# Altium footprint library Nhat_Lib.PcbLib: 84 footprints (part 5 of 6)
Each footprint in its own frame and in the unit in brackets; x right, y up, seen from the top. Pads: shape width x height; smd on the part's side, far side on the other; paste and mask are expansions set on the pad; w line width, h text height; cw(c..) or ccw(c..) is an arc to the next point about the centre after c.
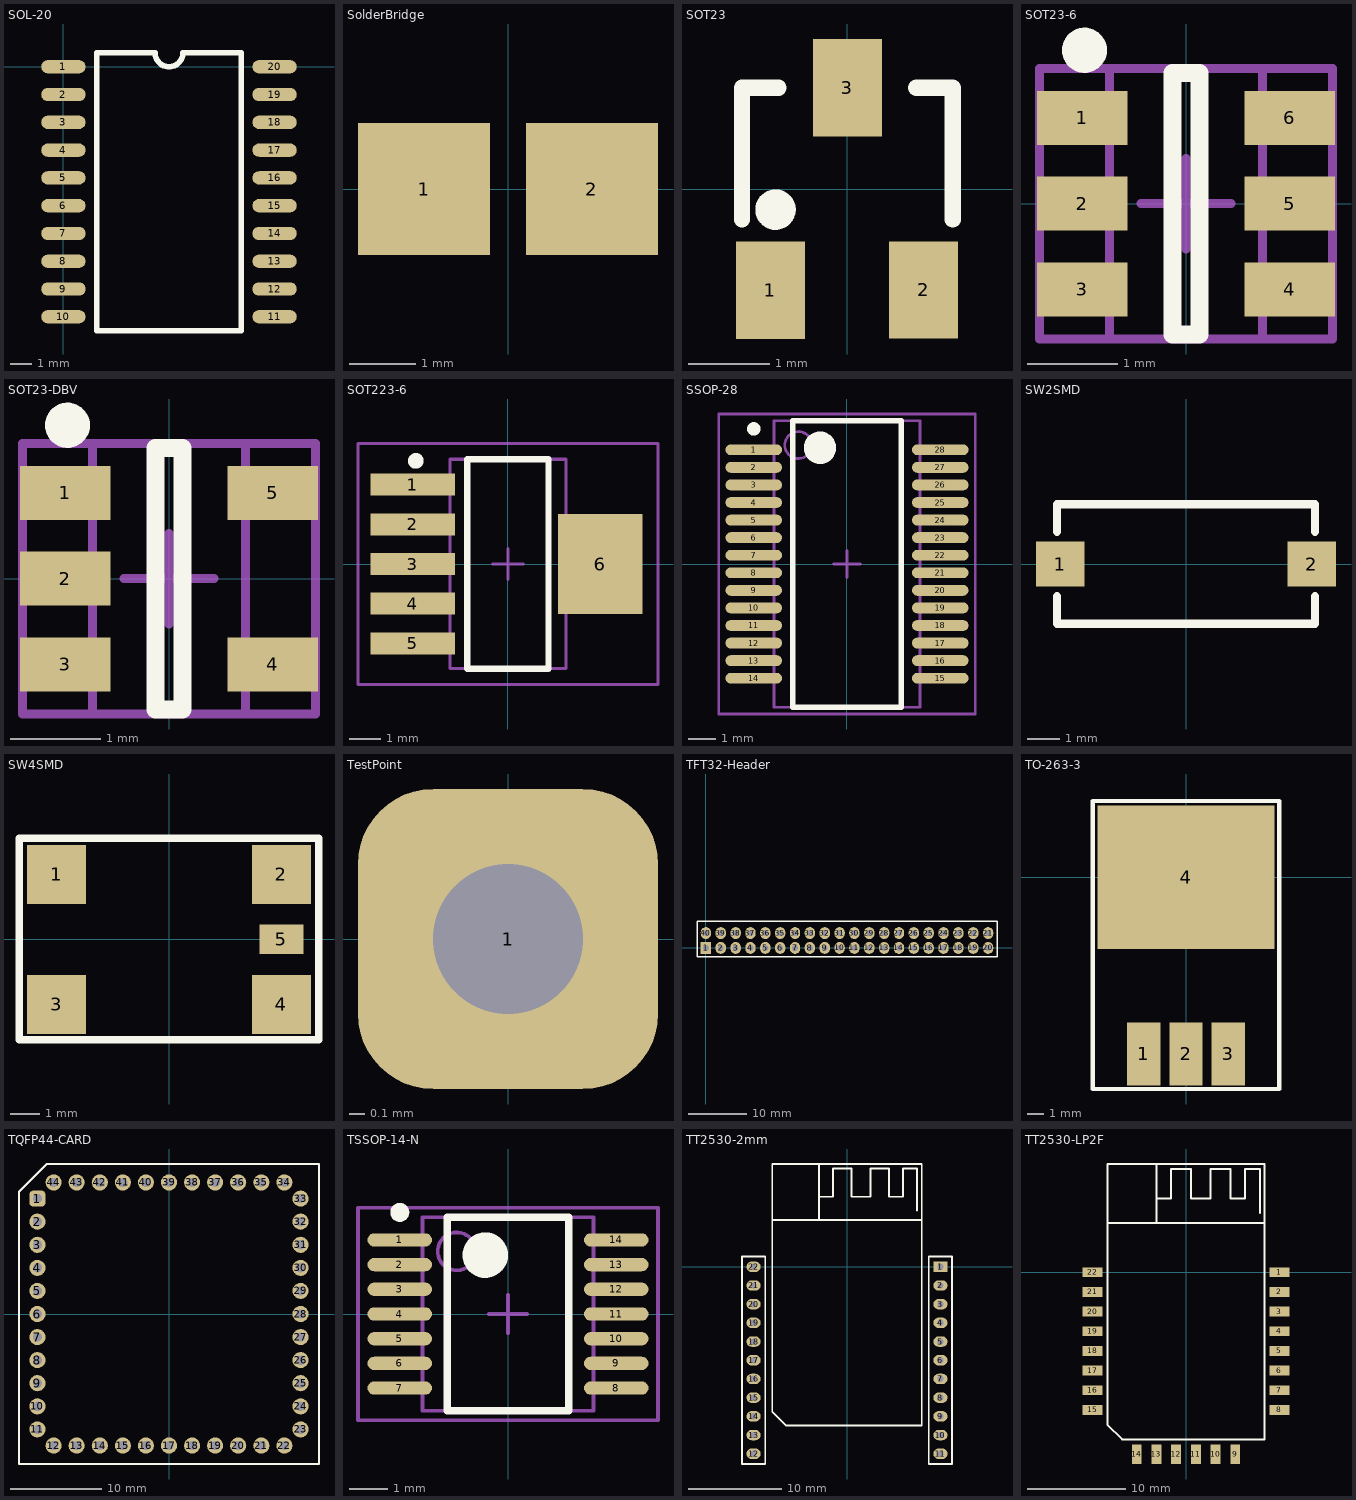
[diagram p4: the footprints below, top view; thin cyan lines are the x and y axes]

## SOL-20 [mil]
pads (20):
  oval 80x24 smd: 1(0,0) 2(0,-50) 3(0,-100) 4(0,-150) 5(0,-200) 6(0,-250) 7(0,-300) 8(0,-350) 9(0,-400) 10(0,-450) 11(380,-450) 12(380,-400) 13(380,-350) 14(380,-300) 15(380,-250) 16(380,-200) 17(380,-150) 18(380,-100) 19(380,-50) 20(380,0)
Top Overlay:
  lines w10: 60,-475 60,25 165,25 ccw(c190,25) 215,25 320,25 320,-475 60,-475

## SolderBridge [mm]
pads (2):
  rect 2x2 smd: 1(-1.27,0) 2(1.27,0)

## SOT23 [mm]
pads (3):
  rect 0.85x1.2 smd: 1(-0.95,-1.25) 2(0.94,-1.245) 3(0,1.25)
Top Overlay:
  circle w0.25: c-0.887,-0.254 r0.125
  lines w0.2: -1.3,-0.375 -1.3,1.25 -0.85,1.25 ; 0.85,1.25 1.3,1.25 1.3,-0.375
3D body: height 1.3, standoff 0, extent -1.45,-1.4 1.45,1.4

## SOT23-6 [mm]
pads (6):
  rect 1x0.6 smd: 1(-1.15,0.95) 2(-1.15,0) 3(-1.15,-0.95) 4(1.15,-0.95) 5(1.15,0) 6(1.15,0.95)
Top Overlay:
  circle w0.25: c-1.125,1.7 r0.125
  lines w0.2: -0.15,-1.45 0.15,-1.45 0.15,1.45 -0.15,1.45 -0.15,-1.45
Mechanical 13:
  lines w0.1: -0.85,-1.5 -0.85,1.5 0.85,1.5 0.85,-1.5 -0.85,-1.5
Mechanical 15:
  lines w0.1: -0.5,0 0.5,0 ; 0,-0.5 0,0.5 ; -1.625,-1.5 -1.625,1.5 1.625,1.5 1.625,-1.5 -1.625,-1.5
3D body: height 1.45, standoff 0, extent -1.4,-1.45 1.4,1.45

## SOT23-DBV [mm]
pads (5):
  rect 1x0.6 smd: 1(-1.15,0.95) 2(-1.15,0) 3(-1.15,-0.95) 4(1.15,-0.95) 5(1.15,0.95)
Top Overlay:
  circle w0.25: c-1.125,1.7 r0.125
  lines w0.2: -0.15,-1.45 -0.15,1.45 0.15,1.45 0.15,-1.45 -0.15,-1.45
Mechanical 13:
  lines w0.1: -0.85,-1.5 0.85,-1.5 0.85,1.5 -0.85,1.5 -0.85,-1.5
Mechanical 15:
  lines w0.1: -0.5,0 0.5,0 ; 0,-0.5 0,0.5 ; -1.625,-1.5 1.625,-1.5 1.625,1.5 -1.625,1.5 -1.625,-1.5
3D body: height 1.1, standoff 0, extent -0.85,-1.5 0.85,1.5

## SOT223-6 [mm]
pads (6):
  rect 2.7x0.7 smd: 1(-3.048,2.54) 2(-3.048,1.27) 3(-3.048,0) 4(-3.048,-1.27) 5(-3.048,-2.54)
  rect 2.7x3.2 smd: 6(2.95,0)
Top Overlay:
  circle w0.25: c-2.95,3.3 r0.125
  lines w0.2: -1.3,-3.35 1.3,-3.35 1.3,3.35 -1.3,3.35 -1.3,-3.35
Mechanical 13:
  lines w0.1: -1.85,-3.35 1.85,-3.35 1.85,3.35 -1.85,3.35 -1.85,-3.35
Mechanical 15:
  lines w0.1: -0.5,0 0.5,0 ; 0,-0.5 0,0.5 ; -4.8,-3.85 4.8,-3.85 4.8,3.85 -4.8,3.85 -4.8,-3.85
3D body: height 1.8, standoff 0, extent -1.85,-3.35 1.85,3.35

## SSOP-28 [mm]
pads (28):
  oval 2.1x0.4 smd: 1(-3.45,4.225) 2(-3.45,3.575) 3(-3.45,2.925) 4(-3.45,2.275) 5(-3.45,1.625) 6(-3.45,0.975) 7(-3.45,0.325) 8(-3.45,-0.325) 9(-3.45,-0.975) 10(-3.45,-1.625) 11(-3.45,-2.275) 12(-3.45,-2.925) 13(-3.45,-3.575) 14(-3.45,-4.225) 15(3.45,-4.225) 16(3.45,-3.575) 17(3.45,-2.925) 18(3.45,-2.275) 19(3.45,-1.625) 20(3.45,-0.975) 21(3.45,-0.325) 22(3.45,0.325) 23(3.45,0.975) 24(3.45,1.625) 25(3.45,2.275) 26(3.45,2.925) 27(3.45,3.575) 28(3.45,4.225)
Top Overlay:
  circle w0.25: c-3.45,5 r0.125
  circle w0.6: c-1,4.3 r0.3
  lines w0.2: -2,-5.3 -2,5.3 2,5.3 2,-5.3 -2,-5.3
Mechanical 13:
  circle w0.1: c-1.8,4.4 r0.5
  lines w0.1: -2.7,-5.3 -2.7,5.3 2.7,5.3 2.7,-5.3 -2.7,-5.3
Mechanical 15:
  lines w0.1: -0.5,0 0.5,0 ; 0,-0.5 0,0.5 ; -4.75,-5.55 -4.75,5.55 4.75,5.55 4.75,-5.55 -4.75,-5.55
3D body: height 2, standoff 0, extent -2.7,-5.3 2.7,5.3

## SW2SMD [mm]
height 2.5
pads (2):
  rect 1.5x1.4 smd: 1(-3.9,0) 2(3.9,0)
Top Overlay:
  lines w0.254: -4,-1 -4,-1.85 4,-1.85 4,-1 ; -4,1 -4,1.85 4,1.85 4,1
3D body: height 2.5, standoff 0, extent -4,-1.8 4,1.8

## SW4SMD [mm] "SMD Tact Switch 6x6x3 mm"
pads (5):
  rect 2x2 smd: 1(-3.81,2.2) 2(3.81,2.2) 3(-3.81,-2.2) 4(3.81,-2.2)
  rect 1.5x1 smd: 5(3.81,0)
Top Overlay:
  lines w0.254: -5.08,-3.404 -5.08,3.429 5.08,3.429 5.08,-3.404 -5.08,-3.404

## TestPoint [mm]
pads (1):
  rrect50% 2x2 hole 1: 1(0,0)

## TFT32-Header [mil]
pads (40):
  rect 70x80 hole 40: 1(0,0)
  oval 70x80 hole 40: 2(100,0) 3(200,0) 4(300,0) 5(400,0) 6(500,0) 7(600,0) 8(700,0) 9(800,0) 10(900,0) 11(1000,0) 12(1100,0) 13(1200,0) 14(1300,0) 15(1400,0) 16(1500,0) 17(1600,0) 18(1700,0) 19(1800,0) 20(1900,0) 21(1900,100) 22(1800,100) 23(1700,100) 24(1600,100) 25(1500,100) 26(1400,100) 27(1300,100) 28(1200,100) 29(1100,100) 30(1000,100) 31(900,100) 32(800,100) 33(700,100) 34(600,100) 35(500,100) 36(400,100) 37(300,100) 38(200,100) 39(100,100) 40(0,100)
Top Overlay:
  lines w10: 940,-60 1960,-60 1960,60 1960,180 940,180 ; 960,-60 -60,-60 -60,60 -60,180 960,180

## TO-263-3 [mm] "DDPAK & DPAK"
pads (4):
  rect 2x3.8 smd: 1(-2.54,-10.6) 2(0,-10.6) 3(2.54,-10.6)
  rect 10.6x8.6 smd: 4(0,0)
Top Overlay:
  lines w0.254: -5.588,-12.7 5.588,-12.7 5.588,4.572 -5.588,4.572 -5.588,-12.7
3D body: height 4.78, standoff -0.02, extent -5,-12.102 5,3.568

## TQFP44-CARD [mil] "TQPF44, P-0.8mm, from TME"
height 20
pads (44):
  rrect50% 70x70 hole 40: 1(-570,500)
  round 70 hole 40: 2(-570,400) 3(-570,300) 4(-570,200) 5(-570,100) 6(-570,0) 7(-570,-100) 8(-570,-200) 9(-570,-300) 10(-570,-400) 11(-570,-500) 12(-500,-570) 13(-400,-570) 14(-300,-570) 15(-200,-570) 16(-100,-570) 17(0,-570) 18(100,-570) 19(200,-570) 20(300,-570) 21(400,-570) 22(500,-570) 23(570,-500) 24(570,-400) 25(570,-300) 26(570,-200) 27(570,-100) 28(570,0) 29(570,100) 30(570,200) 31(570,300) 32(570,400) 33(570,500) 34(500,570) 35(400,570) 36(300,570) 37(200,570) 38(100,570) 39(0,570) 40(-100,570) 41(-200,570) 42(-300,570) 43(-400,570) 44(-500,570)
Top Overlay:
  lines w10: -650,-650 650,-650 650,650 -530,650 -650,530 -650,-650

## TSSOP-14-N [mm]
pads (14):
  oval 1.7x0.35 smd: 1(-2.85,1.95) 2(-2.85,1.3) 3(-2.85,0.65) 4(-2.85,0) 5(-2.85,-0.65) 6(-2.85,-1.3) 7(-2.85,-1.95) 8(2.85,-1.95) 9(2.85,-1.3) 10(2.85,-0.65) 11(2.85,0) 12(2.85,0.65) 13(2.85,1.3) 14(2.85,1.95)
Top Overlay:
  circle w0.25: c-2.85,2.675 r0.125
  circle w0.6: c-0.6,1.55 r0.3
  lines w0.2: -1.6,-2.55 -1.6,2.55 1.6,2.55 1.6,-2.55 -1.6,-2.55
Mechanical 13:
  circle w0.1: c-1.35,1.65 r0.5
  lines w0.1: -2.25,-2.55 -2.25,2.55 2.25,2.55 2.25,-2.55 -2.25,-2.55
Mechanical 15:
  lines w0.1: -0.5,0 0.5,0 ; 0,-0.5 0,0.5 ; -3.95,-2.8 -3.95,2.8 3.95,2.8 3.95,-2.8 -3.95,-2.8
3D body: height 1.1, standoff 0, extent -3.2,-2.5 3.2,2.5

## TT2530-2mm [mil]
pads (22):
  rect 60x44 hole 27: 1(393.7,0)
  oval 60x44 hole 27: 2(393.7,-78.74) 3(393.7,-157.48) 4(393.7,-236.22) 5(393.7,-314.96) 6(393.7,-393.7) 7(393.7,-472.44) 8(393.7,-551.18) 9(393.7,-629.92) 10(393.7,-708.66) 11(393.7,-787.4) 12(-393.7,-787.4) 13(-393.7,-708.66) 14(-393.7,-629.92) 15(-393.7,-551.18) 16(-393.7,-472.44) 17(-393.7,-393.7) 18(-393.7,-314.96) 19(-393.7,-236.22) 20(-393.7,-157.48) 21(-393.7,-78.74) 22(-393.7,0)
Top Overlay:
  lines w8: -442.91,42.6 -442.91,-830.71 -344.49,-830.71 -344.49,42.6 ; -442.91,43.31 -344.49,43.31 ; -118.11,196.85 -118.11,433.07 ; -118.11,295.28 -59.06,295.28 -59.06,413.39 19.68,413.39 19.68,295.28 98.43,295.28 98.43,413.39 177.17,413.39 177.17,295.28 236.22,295.28 236.22,413.39 295.28,413.39 295.28,236.22 ; 344.49,-830.71 442.91,-830.71 ; 344.49,-830 344.49,43.31 442.91,43.31 442.91,-830 ; -314.96,196.85 -314.96,98.43 -314.96,-610.24 -255.91,-669.29 314.96,-669.29 314.96,98.43 314.96,196.85 ; -314.96,196.85 314.96,196.85 ; -314.96,196.85 -314.96,433.07 -118.11,433.07 ; -118.11,433.07 314.96,433.07 314.96,196.85
3D body: height 169.29, standoff 0, extent -440.94,-826.77 -393.7,-748.03
3D body: height 169.29, standoff 0, extent -393.7,-826.77 -346.46,-748.03
3D body: height 169.29, standoff 0, extent -393.7,-748.03 -346.46,-669.29
3D body: height 169.29, standoff 0, extent -440.94,-748.03 -393.7,-669.29
3D body: height 169.29, standoff 0, extent -440.94,-590.55 -393.7,-511.81
3D body: height 169.29, standoff 0, extent -393.7,-590.55 -346.46,-511.81
3D body: height 169.29, standoff 0, extent -393.7,-669.29 -346.46,-590.55
3D body: height 169.29, standoff 0, extent -440.94,-669.29 -393.7,-590.55
3D body: height 169.29, standoff 0, extent -440.94,-354.33 -393.7,-275.59
3D body: height 169.29, standoff 0, extent -393.7,-354.33 -346.46,-275.59
3D body: height 169.29, standoff 0, extent -393.7,-275.59 -346.46,-196.85
3D body: height 169.29, standoff 0, extent -440.94,-275.59 -393.7,-196.85
3D body: height 169.29, standoff 0, extent -440.94,-433.07 -393.7,-354.33
3D body: height 169.29, standoff 0, extent -393.7,-433.07 -346.46,-354.33
3D body: height 169.29, standoff 0, extent -393.7,-511.81 -346.46,-433.07
3D body: height 169.29, standoff 0, extent -440.94,-511.81 -393.7,-433.07
3D body: height 169.29, standoff 0, extent -440.94,-118.11 -393.7,-39.37
3D body: height 169.29, standoff 0, extent -393.7,-118.11 -346.46,-39.37
3D body: height 169.29, standoff 0, extent -393.7,-196.85 -346.46,-118.11
3D body: height 169.29, standoff 0, extent -440.94,-196.85 -393.7,-118.11
3D body: height 169.29, standoff 0, extent -393.7,-39.37 -346.46,39.37
3D body: height 169.29, standoff 0, extent -440.94,-39.37 -393.7,39.37
3D body: height 169.29, standoff 0, extent 393.7,-39.37 440.94,39.37
3D body: height 169.29, standoff 0, extent 346.46,-39.37 393.7,39.37
3D body: height 169.29, standoff 0, extent 346.46,-118.11 393.7,-39.37
3D body: height 169.29, standoff 0, extent 393.7,-118.11 440.94,-39.37
3D body: height 169.29, standoff 0, extent 393.7,-275.59 440.94,-196.85
3D body: height 169.29, standoff 0, extent 346.46,-275.59 393.7,-196.85
3D body: height 169.29, standoff 0, extent 346.46,-196.85 393.7,-118.11
3D body: height 169.29, standoff 0, extent 393.7,-196.85 440.94,-118.11
3D body: height 169.29, standoff 0, extent 393.7,-511.81 440.94,-433.07
3D body: height 169.29, standoff 0, extent 346.46,-511.81 393.7,-433.07
3D body: height 169.29, standoff 0, extent 346.46,-590.55 393.7,-511.81
3D body: height 169.29, standoff 0, extent 393.7,-590.55 440.94,-511.81
3D body: height 169.29, standoff 0, extent 393.7,-433.07 440.94,-354.33
3D body: height 169.29, standoff 0, extent 346.46,-433.07 393.7,-354.33
3D body: height 169.29, standoff 0, extent 346.46,-354.33 393.7,-275.59
3D body: height 169.29, standoff 0, extent 393.7,-354.33 440.94,-275.59
3D body: height 169.29, standoff 0, extent 393.7,-748.03 440.94,-669.29
3D body: height 169.29, standoff 0, extent 346.46,-748.03 393.7,-669.29
3D body: height 169.29, standoff 0, extent 346.46,-669.29 393.7,-590.55
3D body: height 169.29, standoff 0, extent 393.7,-669.29 440.94,-590.55
3D body: height 169.29, standoff 0, extent 346.46,-826.77 393.7,-748.03
3D body: height 169.29, standoff 0, extent 393.7,-826.77 440.94,-748.03

## TT2530-LP2F [mm]
pads (22):
  rect 2x1 smd: 1(9.5,0) 2(9.5,-2) 3(9.5,-4) 4(9.5,-6) 5(9.5,-8) 6(9.5,-10) 7(9.5,-12) 8(9.5,-14) 15(-9.5,-14) 16(-9.5,-12) 17(-9.5,-10) 18(-9.5,-8) 19(-9.5,-6) 20(-9.5,-4) 21(-9.5,-2) 22(-9.5,0)
  rect 1x2 smd: 9(5,-18.5) 10(3,-18.5) 11(1,-18.5) 12(-1,-18.5) 13(-3,-18.5) 14(-5,-18.5)
Top Overlay:
  lines w0.203: -3,5 -3,11 ; -3,7.5 -1.5,7.5 -1.5,10.5 0.5,10.5 0.5,7.5 2.5,7.5 2.5,10.5 4.5,10.5 4.5,7.5 6,7.5 6,10.5 7.5,10.5 7.5,6 ; -8,5 -8,11 -3,11 ; -8,5 8,5 ; -8,5 -8,2.5 -8,-15.5 -6.5,-17 8,-17 8,2.5 8,5 ; -3,11 8,11 8,5